# Altium schematic symbol library lib_datalogger.SchLib: 1246 symbols (part 9 of 16) (continued)
## CMP-012-000010-1
designator U?, comment IC ADP3338AKCZ-5-R7 REG LDO 5V 1A SOT223-3 SMD
IC REG LDO 5V 1A SOT223-3; Manufacturer: Analog Devices Inc.; Regulator Topology: Positive Fixed; Number of Regulators: 1; Voltage - Dropout (Typical): 0.19V @ 1A; Voltage - Input: Up to 8V; Source: mits.SchLib; RoHS: RoHS Compliant; Manufacturer Part Number: ADP3338AKCZ-5-R7; Operating Temperature: -40°C ~ 150°C; Voltage - Output: 5V; ComponentLink1Description: http://www.analog.com/media/en/technical-documentation/data-sheets/ADP3338.pdf; Supplier Device Package: SOT-223-3; ComponentLink1URL: http://www.analog.com/media/en/technical-documentation/data-sheets/ADP3338.pdf; Package / Case: TO-261-4, TO-261AA; Part Status: Active; Category: Integrated Circuits (ICs); Current - Limit (Min): -; Stock 1: 196; Current - Output: 1A; Packaging: Cut Tape (CT); Pricing 1: 1=3.03, 10=2.725, 100=2.2324 (USD); Design Item ID: IC ADP3338AKCZ-5-R7 REG LDO 5V 1A SOT223-3 SMD; Mounting Type: Surface Mount
footprint SOT-223
footprint SOT-223
pins: 1 GND, 2 Vout, 3 Vin, 4 Vout

## CMP-012-000011-1
designator U?, comment IC AS4C4M16S SDRAM 64MB 4MX16 54-TSOP
IC SDRAM 64MB 4MX16 54-TSOP; Manufacturer: Alliance Memory, Inc.; Part#: AS4C4M16S-6TAN; eVendor#: 1450-1154-ND; eVendorPrice: 1,81; eVendor: Digi-Key; MSRP: 1,2971; Source: mits.SchLib; Datasheet: http://www.alliancememory.com/pdf/dram/64M-AS4C4M16SA-AUTOMOTIVE.pdf; Obs: --; MOQ: 2000; Design Item ID: IC AS4C4M16S SDRAM 64MB 4MX16 54-TSOP
footprint 54-TSOP II
footprint 54-TSOP II
pins: 1 VDD (power), 2 DQ0 (io), 3 VDDQ (power), 4 DQ1 (io), 5 DQ2 (io), 6 VSSQ (power), 7 DQ3 (io), 8 DQ4 (io), 9 VDDQ (power), 10 DQ5 (io), 11 DQ6 (io), 12 VSSQ (power), 13 DQ7 (io), 14 VDD (power), 15 LDQM (in), 16 WE# (in), 17 CAS# (in), 18 RAS# (in), 19 CS# (in), 20 BA0 (in), 21 BA1 (in), 22 A10/AP (in), 23 A0 (in), 24 A1 (in), 25 A2 (in), 26 A3 (in), 27 VDD (power), 28 VSS (power), 29 A4 (in), 30 A5 (in), 31 A6 (in), 32 A7 (in), 33 A8 (in), 34 A9 (in), 35 A11 (in), 36 NC, 37 CKE (in), 38 CLK (in), 39 UDQM (in), 40 NC/RFU, 41 VSS (power), 42 DQ8 (io), 43 VDDQ (power), 44 DQ9 (io), 45 DQ10 (io), 46 VSSQ (power), 47 DQ11 (io), 48 DQ12 (io), 49 VDDQ (power), 50 DQ13 (io), 51 DQ14 (io), 52 VSSQ (power), 53 DQ15 (io), 54 VSS (power)

## CMP-012-000012-1
designator U?, comment IC AS4C4M16SA SDRAM 4MX16 166MHZ 54TSOP
IC SDRAM 4MX16 166MHZ 54TSOP; Part#: AS4C4M16SA-6TAN; Manufacturer: Alliance Memory, Inc.; eVendor#: 1450-1258-ND; eVendorPrice: 2,21; eVendor: Digi-Key; MSRP: 1,4175; MOQ: 5000; Datasheet: http://www.alliancememory.com/pdf/dram/64M-AS4C4M16SA-Automotive_v3.0_March%202015.pdf; Design Item ID: IC AS4C4M16SA SDRAM 4MX16 166MHZ 54TSOP; Obs: --; Source: mits.SchLib
footprint 54-TSOP II
footprint 54-TSOP II
pins: 1 VDD (power), 2 DQ0 (io), 3 VDDQ (power), 4 DQ1 (io), 5 DQ2 (io), 6 VSSQ (power), 7 DQ3 (io), 8 DQ4 (io), 9 VDDQ (power), 10 DQ5 (io), 11 DQ6 (io), 12 VSSQ (power), 13 DQ7 (io), 14 VDD (power), 15 LDQM (in), 16 WE# (in), 17 CAS# (in), 18 RAS# (in), 19 CS# (in), 20 BA0 (in), 21 BA1 (in), 22 A10/AP (in), 23 A0 (in), 24 A1 (in), 25 A2 (in), 26 A3 (in), 27 VDD (power), 28 VSS (power), 29 A4 (in), 30 A5 (in), 31 A6 (in), 32 A7 (in), 33 A8 (in), 34 A9 (in), 35 A11 (in), 36 NC, 37 CKE (in), 38 CLK (in), 39 UDQM (in), 40 NC/RFU, 41 VSS (power), 42 DQ8 (io), 43 VDDQ (power), 44 DQ9 (io), 45 DQ10 (io), 46 VSSQ (power), 47 DQ11 (io), 48 DQ12 (io), 49 VDDQ (power), 50 DQ13 (io), 51 DQ14 (io), 52 VSSQ (power), 53 DQ15 (io), 54 VSS (power)

## CMP-012-000013-1
designator U?, comment IC AT24C512C EEPROM 512KBIT 1MHZ 8-UFDFN
IC EEPROM 512KBIT 1MHZ 8MINIMAP; Manufacturer: Atmel; Part#: AT24C512C-MAHM-T; eVendor: Digi-Key; eVendorPrice: 1,33; eVendor#: AT24C512C-MAHM-TCT-ND; MSRP: 0,98771; Datasheet: http://media.digikey.com/pdf/Data%20Sheets/Atmel%20PDFs/AT24C512C.pdf; MOQ: 1000; Source: mits.SchLib; Design Item ID: IC AT24C512C EEPROM 512KBIT 1MHZ 8-UFDFN; Obs: --
footprint 8-DFN
footprint 8-DFN
pins: 1 A0 "DEVICE ADDRES 0", 2 A1 "DEVICE ADDRES 1", 3 A2 "DEVICE ADDRES 2", 4 GND "GROUND", 5 SDA "I2C DATA", 6 SCL "I2C DATA CLOCK", 7 WP "WRITE PROTECTION", 8 VCC "3.3V VOLTAGE SUPLY"

## CMP-012-000014-1
designator U?, comment IC AT24CM01 EEPROM 1MBIT 1MHZ 8SOIC
IC EEPROM 1MBIT 1MHZ 8SOIC; Manufacturer: Atmel; Part#: AT24CM01-SSHD-B; eVendor: Digi-Key; MSRP: 1,35075; eVendorPrice: 1,91; eVendor#: AT24CM01-SSHD-B-ND; Obs: --; MOQ: 1000; Design Item ID: IC AT24CM01 EEPROM 1MBIT 1MHZ 8SOIC; Source: mits.SchLib; Datasheet: http://www.atmel.com/Images/Atmel-8812-SEEPROM-AT24CM01-Datasheet.pdf
footprint SOIC-8
footprint SOIC-8
pins: 1 NC "No Connect", 2 A1 "DEVICE ADDRES 1", 3 A2 "DEVICE ADDRES 2", 4 GND "GROUND", 5 SDA "I2C DATA", 6 SCL "I2C DATA CLOCK", 7 WP "WRITE PROTECTION", 8 VCC "3.3V VOLTAGE SUPLY"

## CMP-012-000015-1
designator U?, comment IC AT97SC3205T CRYPTO TPM TSSOP
IC CRYPTO TPM TSSOP; Manufacturer: Atmel; Part#: AT97SC3205T-U3A16-20; eVendor: Digi-Key; eVendorPrice: 3,15131; Obs: Em Falta, AT97SC3204T Disponível; eVendor#: AT97SC3205T-U3A16-20-ND; Source: mits.SchLib; Datasheet: http://www.atmel.com/images/atmel-8883s-tpm-at97sc3205t-datasheet-summary.pdf; Design Item ID: IC AT97SC3205T CRYPTO TPM TSSOP; MOQ: 1000; MSRP: 3,15131
footprint 28-TSSOP
footprint 28-TSSOP
pins: 1 SM_DAT (io) "I2C Data Input/Output", 2 SM_CLK (in) "I2C Clock Input", 3 VCC (power) "Power Supply, 3.3V", 4 GND (power) "System Ground", 5 NC "No Connect Pins", 6 GPIO/EXP-00 (io) "Ganeral Purpose Input/Output", 7 PP/GPIO/TWI_WakeUp# (io) "General Purpose Input/Output", 8 TESTI (in) "Test Input", 9 TESTBI/GPIO/XTAMPER (in) "Test Input", 10 VCC (power) "Power Supply, 3.3V", 11 GND (power) "System Ground", 12 NC "No Connect Pins", 13 NC "No Connect Pins", 14 NC "No Connect Pins", 15 NC "No Connect Pins", 16 LRESET# (in) "Reset Active-Low", 17 GPIO (io) "General Purpose Input/Output", 18 GND (power) "System Ground", 19 VCC (power) "Power Supply, 3.3V", 20 PIRQ# "SPI Interrupt Requests", 21 ATEST "Atmel Test Pins", 22 TWI_WakeUp# (in) "Low-Power Sleep Recovery", 23 ATEST "Atmel Test Pins", 24 VCC (power) "Power Supply, 3.3V", 25 GND (power) "System Ground", 26 ATEST "Atmel Test Pins", 27 NC "No Connect Pins", 28 NC "No Connect Pins"

## CMP-012-000016-2
designator U?, comment ATECC108A-SSHDA-B
ATECC108A Series 10 KB 5.5 V I2C CryptoAuthentication Device - SOIC-8; Manufacturer: Atmel; eVendorPrice: 1,42; eVendor: Digi-Key; eVendor#: ATECC108A-SSHDA-B-ND; MSRP: 0,66555; RoHS Compliant: Yes; Design Item ID: IC ATECC108A EEPROM CRYPTO 8KB I2C 8SOIC; Packaging: Rail/Tube; Part#: ATECC108A-SSHDA-B; Case/Package: SOIC; Source: mits.SchLib; MOQ: 1000; Mount: Surface Mount; Datasheet: http://www.atmel.com/Images/Atmel-8873S-CryptoAuth-ATECC108-Datasheet-Summary.pdf; Obs: --
footprint SOIC-8
footprint SOIC-8
pins: 1 NC "No Connect", 2 NC "No Connect", 3 NC "No Connect", 4 GND (power) "GROUND", 5 SDA (io) "I2C DATA", 6 SCL (in) "I2C DATA CLOCK", 7 NC "No Connect", 8 VCC (power) "3.3V VOLTAGE SUPLY"

## CMP-012-000017-1
designator U?, comment IC BSP452 SWITCH POWER HISIDE SOT223-4 SMD
IC SWITCH POWER HISIDE SOT223-4; Manufacturer: Infineon Technologies; eVendor: Digi-Key; eVendorPrice: 1,79; eVendor#: BSP452CT-ND; MSRP: 0,76818; Obs: -; Design Item ID: IC BSP452 SWITCH POWER HISIDE SOT223-4 SMD; MOQ: 1000; Datasheet: http://www.infineon.com/dgdl/Infineon-BSP452-DS-v01_00-en.pdf?folderId=db3a304314dca389011537739e37155f&fileId=db3a30431b3e89eb011b7eac4d321531&ack=t; Part#: BSP452; Source: mits.SchLib
footprint SOT-223
footprint SOT-223
pins: 1 OUT (out), 2 GND (power), 3 IN (in), 4 Vbb (power)

## CMP-012-000019-1
designator U?, comment IC BY25D40 SPI FLASH 4M SOP-8 150-mil
FLASH FLASH 4M SPI SOP-8 ROHS; Manufacturer 1: BOYAMICRO; Manufacturer Part Number 1: BY25D40ASTIG(T); Mounting Type: Surface Mount; Operating Temperature: -40°C ~ 85°C (TJ); Supplier Device Package: SOP-8; Source: mits.SchLib; Package / Case: SOP-8; Design Item ID: IC BY25D40 SPI FLASH 4M SOP-8 150-mil
footprint SOP8
footprint SOP8
pins: 1 ~{CS}, 2 SO, 3 ~{WP}, 4 VSS (power), 5 SI, 6 SCLK (power), 7 NC, 8 VCC (power)

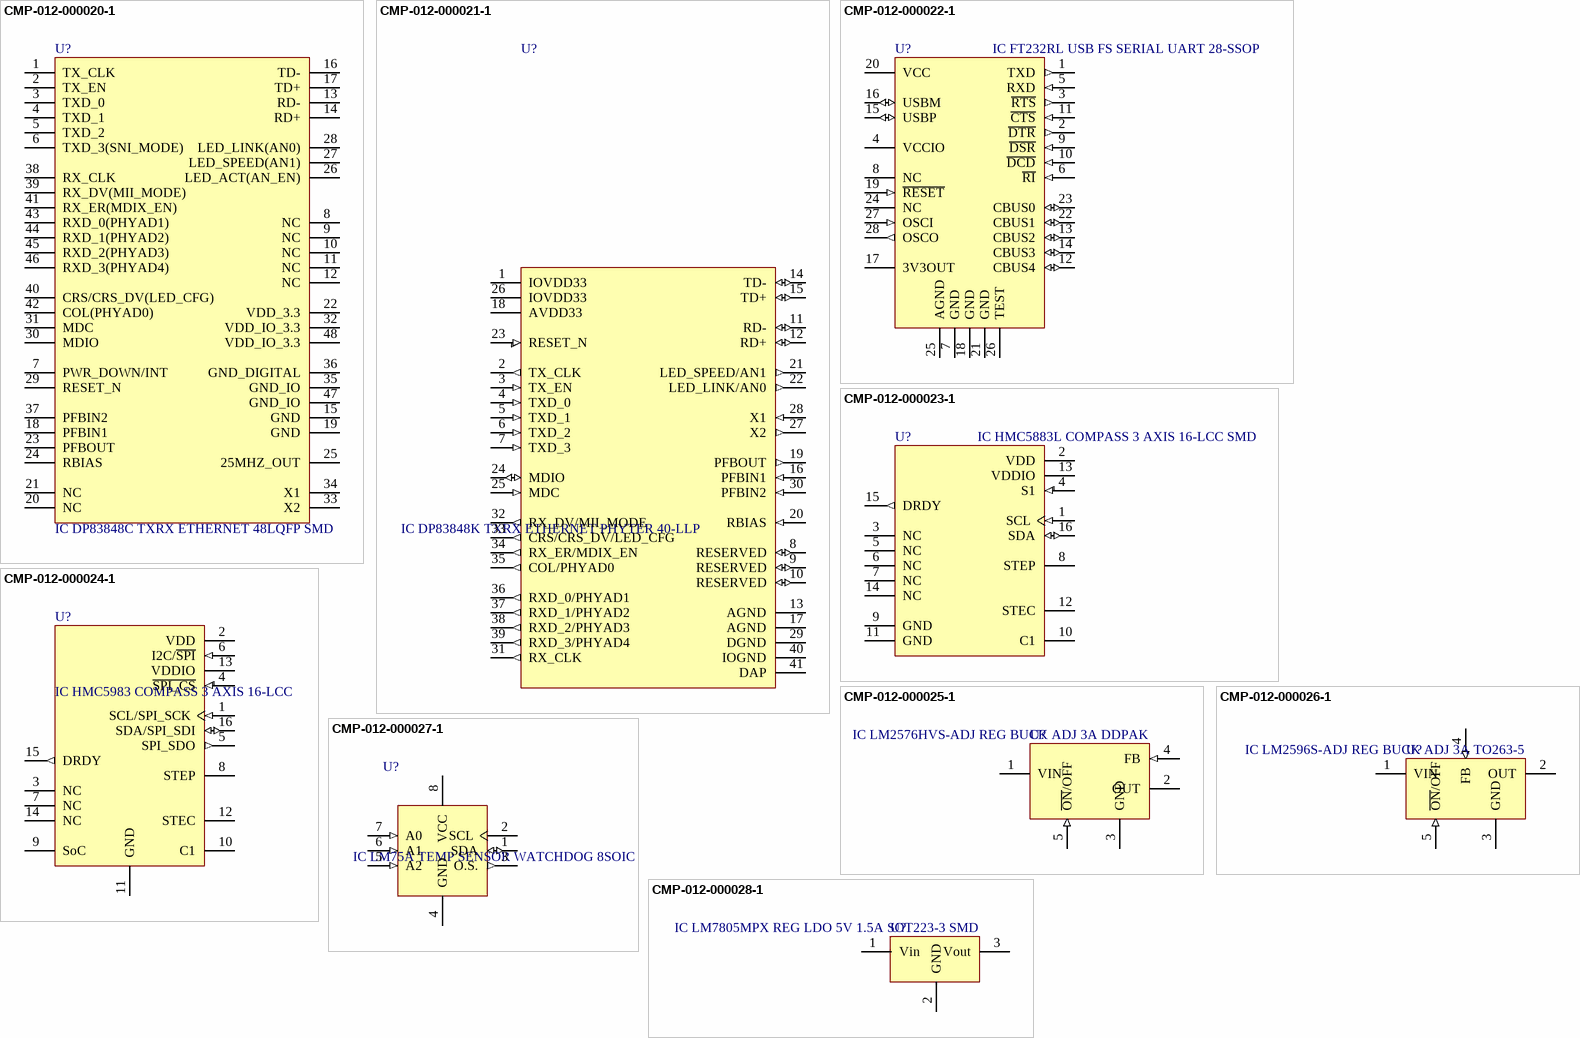
[diagram p25: symbols CMP-012-000020-1 to CMP-012-000028-1]

## CMP-012-000020-1
designator U?, comment IC DP83848C TXRX ETHERNET 48LQFP SMD
IC TXRX ETHERNET 48LQFP; Manufacturer: Texas Instruments; Manufacturer Part Number: DP83848CVVX/NOPB; Voltage - Supply: 3 V ~ 3.6 V; Number of Drivers/Receivers: 1/1; Receiver Hysteresis: -; Category: Integrated Circuits (ICs); Package / Case: 48-LQFP; Operating Temperature: 0°C ~ 70°C; Part Status: Active; RoHS: RoHS Compliant; Pricing 1: 1=5.28, 10=4.743, 100=3.8864, 500=3.30846 (USD); Stock 1: 12268; Design Item ID: IC DP83848C TXRX ETHERNET 48LQFP SMD; Mounting Type: Surface Mount; Duplex: -; Data Rate: -; Type: Transceiver; Protocol: Ethernet; ComponentLink1URL: http://www.ti.com/lit/ds/symlink/dp83848c.pdf; Packaging: Cut Tape (CT); ComponentLink1Description: http://www.ti.com/lit/ds/symlink/dp83848c.pdf; Source: mits.SchLib; Supplier Device Package: 48-LQFP (7x7)
footprint TQFP48
footprint TQFP48
pins: 1 TX_CLK "MII TX CLOCK", 2 TX_EN "MII, RMII TX ENABLE", 3 TXD_0 "DATA0", 4 TXD_1 "DATA0", 5 TXD_2 "DATA0", 6 TXD_3(SNI_MODE) "DATA0", 7 PWR_DOWN/INT "INTERRUPT", 8 NC, 9 NC, 10 NC, 11 NC, 12 NC, 13 RD- "RX- INPUT", 14 RD+ "RX+ INPUT", 15 GND (power) "ANALOG GROUND", 16 TD- "TX- OUTPUT", 17 TD+ "TX+ OUTPUT", 18 PFBIN1, 19 GND (power) "ANALOG GROUND", 20 NC, 21 NC, 22 VDD_3.3 (power) "ANALOG 3.3V SUPLY", 23 PFBOUT, 24 RBIAS, 25 25MHZ_OUT "CLOCK OUTPUT", 26 LED_ACT(AN_EN) "ACTIVITY LED", 27 LED_SPEED(AN1) "SPEED LED", 28 LED_LINK(AN0) "LINK LED", 29 RESET_N "RESET", 30 MDIO "MANAG DATA IO", 31 MDC "MANAG DATA CLK", 32 VDD_IO_3.3 (power) "IO POWER SUPLY", 33 X2 "CRYSTAL OUTPUT", 34 X1 "CRYSTAL/OSC INPUT", 35 GND_IO (power) "IO POWER SUPLY", 36 GND_DIGITAL (power) "DIGITAL GROUND", 37 PFBIN2, 38 RX_CLK "MII RX CLOCK", 39 RX_DV(MII_MODE) "RECEVIVE DATA VALID", 40 CRS/CRS_DV(LED_CFG) "CARRIER SENSE", 41 RX_ER(MDIX_EN) "RECEVIVE ERROR", 42 COL(PHYAD0) "COLISION DETECT", 43 RXD_0(PHYAD1) "RECEIVE DATA", 44 RXD_1(PHYAD2) "RECEIVE DATA", 45 RXD_2(PHYAD3) "RECEIVE DATA", 46 RXD_3(PHYAD4) "RECEIVE DATA", 47 GND_IO (power) "IO POWER SUPLY", 48 VDD_IO_3.3 (power) "IO POWER SUPLY"

## CMP-012-000021-1
designator U?, comment IC DP83848K TXRX ETHERNET PHYTER 40-LLP
IC TXRX ETHERNET PHYTER 40-LLP; Part#: DP83848KSQ/NOPB; Manufacturer: Texas Instruments; MSRP: 1,98; eVendor: Digi-Key; eVendor#: DP83848KSQ/NOPBCT-ND; eVendorPrice: 2,73; Datasheet: http://www.ti.com/lit/ds/symlink/dp83848k.pdf; Design Item ID: IC DP83848K TXRX ETHERNET PHYTER 40-LLP; Source: mits.SchLib; MOQ: 1000; Obs: --
footprint SQA40B (QFN, 40-Leads, Body 6x6mm, Pitch 0.5mm, NSC Recommended)
footprint SQA40B (QFN, 40-Leads, Body 6x6mm, Pitch 0.5mm, NSC Recommended)
pins: 1 IOVDD33 (power) "IO POWER SUPLY", 2 TX_CLK (out) "MII TRANSMIT CLOCK", 3 TX_EN (in) "MII/RMII TRANSMIT ENABLE", 4 TXD_0 (in) "MII/RMII TRANSMIT DATA", 5 TXD_1 (in) "MII/RMII TRANSMIT DATA", 6 TXD_2 (in) "MII/RMII TRANSMIT DATA", 7 TXD_3 (in) "MII/RMII TRANSMIT DATA", 8 RESERVED (io), 9 RESERVED (io), 10 RESERVED (io), 11 RD- (io) "RX- INPUT", 12 RD+ (io) "RX+ INPUT", 13 AGND (power) "ANALOG GROUND", 14 TD- (io) "TX- OUTPUT", 15 TD+ (io) "TX+ OUTPUT", 16 PFBIN1 (in), 17 AGND (power) "ANALOG GROUND", 18 AVDD33 (power) "IO POWER SUPLY", 19 PFBOUT (out), 20 RBIAS (in), 21 LED_SPEED/AN1 (out) "SPEED LED", 22 LED_LINK/AN0 (out) "LINK LED / LINK/ACT LED", 23 RESET_N (in) "RESET", 24 MDIO (io) "MANAGEMENT DATA I/O", 25 MDC (in) "MANAGEMENT DATA CLOCK", 26 IOVDD33 (power) "IO POWER SUPLY", 27 X2 (out) "CRYSTAL OUTPUT", 28 X1 (in) "CRYSTAL/OSC INPUT", 29 DGND (power) "DIGITAL GROUND", 30 PFBIN2 (in), 31 RX_CLK (out) "MII RECEIVE CLOCK", 32 RX_DV/MII_MODE (out) "MII RECEIVE DATA VALID / RMII Synchronous Receive Data Valid", 33 CRS/CRS_DV/LED_CFG (out) "MII/RMII CARRIER SENSE / RECEIVE DATA VALID", 34 RX_ER/MDIX_EN (out) "MII/RMII RECEVIVE ERROR", 35 COL/PHYAD0 (out) "MII/RMII COLISION DETECT", 36 RXD_0/PHYAD1 (out) "MII/RMII RECEIVE DATA", 37 RXD_1/PHYAD2 (out) "MII/RMII RECEIVE DATA", 38 RXD_2/PHYAD3 (out) "MII/RMII RECEIVE DATA", 39 RXD_3/PHYAD4 (out) "MII/RMII RECEIVE DATA", 40 IOGND (power) "IO POWER SUPLY", 41 DAP (power) "Die Attached Pad (DAP)"

## CMP-012-000022-1
designator U?, comment IC FT232RL USB FS SERIAL UART 28-SSOP
IC USB FS SERIAL UART 28-SSOP; Manufacturer: FTDI, Future Technology Devices International Ltd; Part#: FT232RL-REEL; eVendor: Digi-Key; eVendorPrice: 4,50; eVendor#: 768-1007-1-ND; MSRP: 2,85; MOQ: 1000; Design Item ID: IC FT232RL USB FS SERIAL UART 28-SSOP; Source: mits.SchLib; Datasheet: http://www.ftdichip.com/Support/Documents/DataSheets/ICs/DS_FT232R.pdf
footprint SSOP28_65P780X200 (SOP, 28-Leads, Body 10,5x5,6mm (max), Pitch 0,65mm, IPC Medium Density)
footprint SSOP28_65P780X200 (SOP, 28-Leads, Body 10,5x5,6mm (max), Pitch 0,65mm, IPC Medium Density)
pins: 1 TXD (out), 2 ~{DTR} (out), 3 ~{RTS} (out), 4 VCCIO (power), 5 RXD (in), 6 ~{RI} (in), 7 GND (power), 8 NC, 9 ~{DSR} (in), 10 ~{DCD} (in), 11 ~{CTS} (in), 12 CBUS4 (io), 13 CBUS2 (io), 14 CBUS3 (io), 15 USBP (io), 16 USBM (io), 17 3V3OUT (power), 18 GND (power), 19 ~{RESET} (in), 20 VCC (power), 21 GND (power), 22 CBUS1 (io), 23 CBUS0 (io), 24 NC, 25 AGND (power), 26 TEST (power), 27 OSCI (in), 28 OSCO (out)

## CMP-012-000023-1
designator U?, comment IC HMC5883L COMPASS 3 AXIS 16-LCC SMD
IC COMPASS 3 AXIS 16-LCC SMD; Manufacturer: Honeywell Microelectronics & Precision Sensors; Part#: HMC5883L-TR; eVendor#: 342-1082-1-ND; MSRP: 2,37; eVendorPrice: 5,55; eVendor: Digi-Key; Datasheet: http://www51.honeywell.com/aero/common/documents/myaerospacecatalog-documents/Defense_Brochures-documents/HMC5883L_3-Axis_Digital_Compass_IC.pdf; Design Item ID: IC HMC5883L COMPASS 3 AXIS 16-LCC SMD; MOQ: 1000; Source: mits.SchLib
footprint 16-LPCC
footprint 16-LPCC
pins: 1 SCL (in) "Serial Clock – I²C Master/Slave Clock", 2 VDD (power) "Power Supply (2.16V to 3.6V)", 3 NC "Not to be Connected", 4 S1 (in) "Chip Select line for SPI (active low). Tie to VDDIO for I²C Interface", 5 NC "Not to be Connected", 6 NC "Not to be Connected. No internal connection.", 7 NC "Not to be Connected", 8 STEP "Set/Reset Strap Positive – S/R Capacitor (C2) Connection", 9 GND (power) "Supply Ground", 10 C1 "Reservoir Capacitor (C1) Connection", 11 GND (power) "Supply Ground", 12 STEC "S/R Capacitor (C2) Connection – Driver Side", 13 VDDIO (power) "IO Power Supply (1.71V to VDD)", 14 NC "Not to be Connected. No internal connection.", 15 DRDY (out) "Data Ready, Interrupt Pin. Internally pulled high. Optional connection. Low for >200 µsec when data are placed in the data output registers.", 16 SDA (io) "Serial Data – I²C Master/Slave Data"

## CMP-012-000024-1
designator U?, comment IC HMC5983 COMPASS 3 AXIS 16-LCC
IC COMPASS 3 AXIS 16-LCC; Manufacturer: Honeywell Microelectronics & Precision Sensors; Part#: HMC5983-TR; eVendor: Digi-Key; MSRP: 1,57865; eVendorPrice: 3,37; eVendor#: 342-1092-1-ND; Design Item ID: IC HMC5983 COMPASS 3 AXIS 16-LCC; MOQ: 1000; Datasheet: http://www51.honeywell.com/aero/common/documents/myaerospacecatalog-documents/Defense_Brochures-documents/HMC5983_3_Axis_Compass_IC.pdf; Source: mits.SchLib
footprint 16-LPCC
footprint 16-LPCC
pins: 1 SCL/SPI_SCK (in) "Serial Clock – I²C Master/Slave Clock or SPI Serial Clock", 2 VDD (power) "Power Supply (2.16V to 3.6V)", 3 NC "Not to be Connected", 4 ~{SPI_CS} (in) "Chip Select line for SPI (active low). Tie to VDDIO for I²C Interface", 5 SPI_SDO (out) "SPI Serial Data Out", 6 I2C/~{SPI} (in) "I²C / SPI selection pin. Connect to VDD for I²C (Also connect SPI_CS to VDDIO).  Connect to GND for SPI.", 7 NC "Not to be Connected", 8 STEP "Set/Reset Strap Positive – S/R Capacitor (C2) Connection", 9 SoC "Start of Conversion (leading edge active) Connect to Ground when this  function/pad is not used in application.", 10 C1 "Reservoir Capacitor (C1) Connection", 11 GND (power) "Supply Ground", 12 STEC "S/R Capacitor (C2) Connection – Driver Side", 13 VDDIO (power) "IO Power Supply (1.71V to VDD)", 14 NC "Not to be Connected. No internal connection.", 15 DRDY (out) "Data Ready, Interrupt Pin. Internally pulled high. Optional connection. Low for >200 µsec when data are placed in the data output registers.", 16 SDA/SPI_SDI (io) "Serial Data – I²C Master/Slave Data or SPI Serial Data In or SPI Serial Data I/O  (SDI/O) for 3-wire interface"

## CMP-012-000025-1
designator U?, comment IC LM2576HVS-ADJ REG BUCK ADJ 3A DDPAK
IC REG BUCK ADJ 3A DDPAK; Manufacturer Part Number: LM2576HVSX-ADJ/NOPB; Manufacturer: Texas Instruments; Synchronous Rectifier: No; Voltage - Output (Max): 57V; Output Type: Adjustable; Voltage - Output (Min/Fixed): 1.23V; Output Configuration: Positive; Voltage - Input (Max): 60V; Voltage - Input (Min): 4V; Frequency - Switching: 52kHz; Number of Outputs: 1; Function: Step-Down; Category: Integrated Circuits (ICs); Topology: Buck; Source: mits.SchLib; Pricing 1: 1=6.28, 10=5.635, 100=4.623 (USD); Packaging: Cut Tape (CT); Operating Temperature: -40°C ~ 125°C (TJ); Design Item ID: IC LM2576HVS-ADJ REG BUCK ADJ 3A DDPAK; ComponentLink1Description: http://www.ti.com/lit/ds/symlink/lm2576hv.pdf; Stock 1: 2785; Package / Case: TO-263-6, D²Pak (5 Leads + Tab), TO-263BA; Supplier Device Package: DDPAK/TO-263-5; RoHS: RoHS Compliant By Exemption; ComponentLink1URL: http://www.ti.com/lit/ds/symlink/lm2576hv.pdf; Mounting Type: Surface Mount; Current - Output: 3A
footprint TO263-5
footprint TO263-5
pins: 1 VIN (power), 2 OUT (power), 3 GND (power), 4 FB (in), 5 ~{ON}/OFF (in)

## CMP-012-000026-1
designator U?, comment IC LM2596S-ADJ REG BUCK ADJ 3A TO263-5
IC REG BUCK ADJ 3A TO263-5; Manufacturer: Texas Instruments; Manufacturer Part Number: LM2596S-ADJ/NOPB; Voltage - Input (Max): 40V; Voltage - Output (Max): 37V; Voltage - Output (Min/Fixed): 1.2V; eVendor: Digi-Key; Function: Step-Down; Frequency - Switching: 150kHz; Synchronous Rectifier: No; Output Type: Adjustable; Observação: Na ausência do componente SMD TO263, pode utilizar o componente TH TO220-T de partnumber LM2576HVT-ADJ; Number of Outputs: 1; eVendor#: LM2596S-ADJ/NOPB-ND; eVendorPrice: 5,44; Voltage - Input (Min): 4.5V; Output Configuration: Positive; MSRP: 2,43; Source: mits.SchLib; Supplier Device Package: DDPAK/TO-263-5; Package / Case: TO-263-6, D²Pak (5 Leads + Tab), TO-263BA; Current - Output: 3A; Pricing 1: 1=5.15, 10=4.627, 100=3.7908, 500=3.22704, 1000=2.43 (USD); Operating Temperature: -40°C ~ 125°C (TJ); ComponentLink1URL: http://www.ti.com/lit/ds/symlink/lm2596.pdf; Mounting Type: Surface Mount; MOQ: 1000; Category: Integrated Circuits (ICs); RoHS: RoHS Compliant By Exemption; Part#: LM2596S-ADJ/NOPB; Design Item ID: IC LM2596S-ADJ REG BUCK ADJ 3A TO263-5; Topology: Buck; Datasheet: http://www.ti.com/lit/ds/symlink/lm2596.pdf; ComponentLink1Description: http://www.ti.com/lit/ds/symlink/lm2596.pdf; Stock 1: 1915; Packaging: Tube
footprint TO263-5
footprint TO263-5
pins: 1 VIN (power), 2 OUT (power), 3 GND (power), 4 FB (in), 5 ~{ON}/OFF (in)

## CMP-012-000027-1
designator U?, comment IC LM75A TEMP SENSOR WATCHDOG 8SOIC
IC TEMP SENSOR WATCHDOG 8SOIC; Part#: LM75AIMX/NOPB; Manufacturer: Texas Instruments; eVendorPrice: 1,85; eVendor: Digi-Key; eVendor#: LM75AIMX/NOPBCT-ND; MSRP: 0,50625; Design Item ID: IC LM75A TEMP SENSOR WATCHDOG 8SOIC; MOQ: 1000; Obs: --; Datasheet: http://www.ti.com/lit/ds/symlink/lm75a.pdf; Source: mits.SchLib
footprint SOIC-8
footprint SOIC-8
pins: 1 SDA (io) "I2C DATA", 2 SCL "I2C DATA CLOCK", 3 O.S. (out) "Overtemperature Shutdown, Open Drain Output", 4 GND "GROUND", 5 A2 (in) "DEVICE ADDRES 2", 6 A1 (in) "DEVICE ADDRES 1", 7 A0 (in) "DEVICE ADDRES 0", 8 VCC "3.3V VOLTAGE SUPLY"

## CMP-012-000028-1
designator U?, comment IC LM7805MPX REG LDO 5V 1.5A SOT223-3 SMD
IC REG LINEAR 5V 1.5A SOT223-4; Manufacturer Part Number: LM7805MPX/NOPB; Manufacturer: Texas Instruments; Quiescent Current: 8mA; Dropout Voltage: 2V; ComponentLink1URL: http://www.ti.com/lit/ds/symlink/lm340.pdf; Pricing 1: 1=1,36000, 10=1,21500, 25=1,15360, 100=0,88580, 250=0,78280, 500=0,74160, 1000=0,57680 (USD); Design Item ID: IC LM7805MPX REG LDO 5V 1.5A SOT223-3 SMD; Lead Free: Lead Free; Stock 1: 3664; Category: Voltage Regulators - Linear; RoHS: No; ComponentLink1Description: http://www.ti.com/lit/ds/symlink/lm340.pdf; Min Operating Temperature: 0°C; Max Operating Temperature: 125°C; Source: mits.SchLib
footprint SOT-223
footprint SOT-223
pins: 1 Vin, 2 GND, 3 Vout, 4 GND

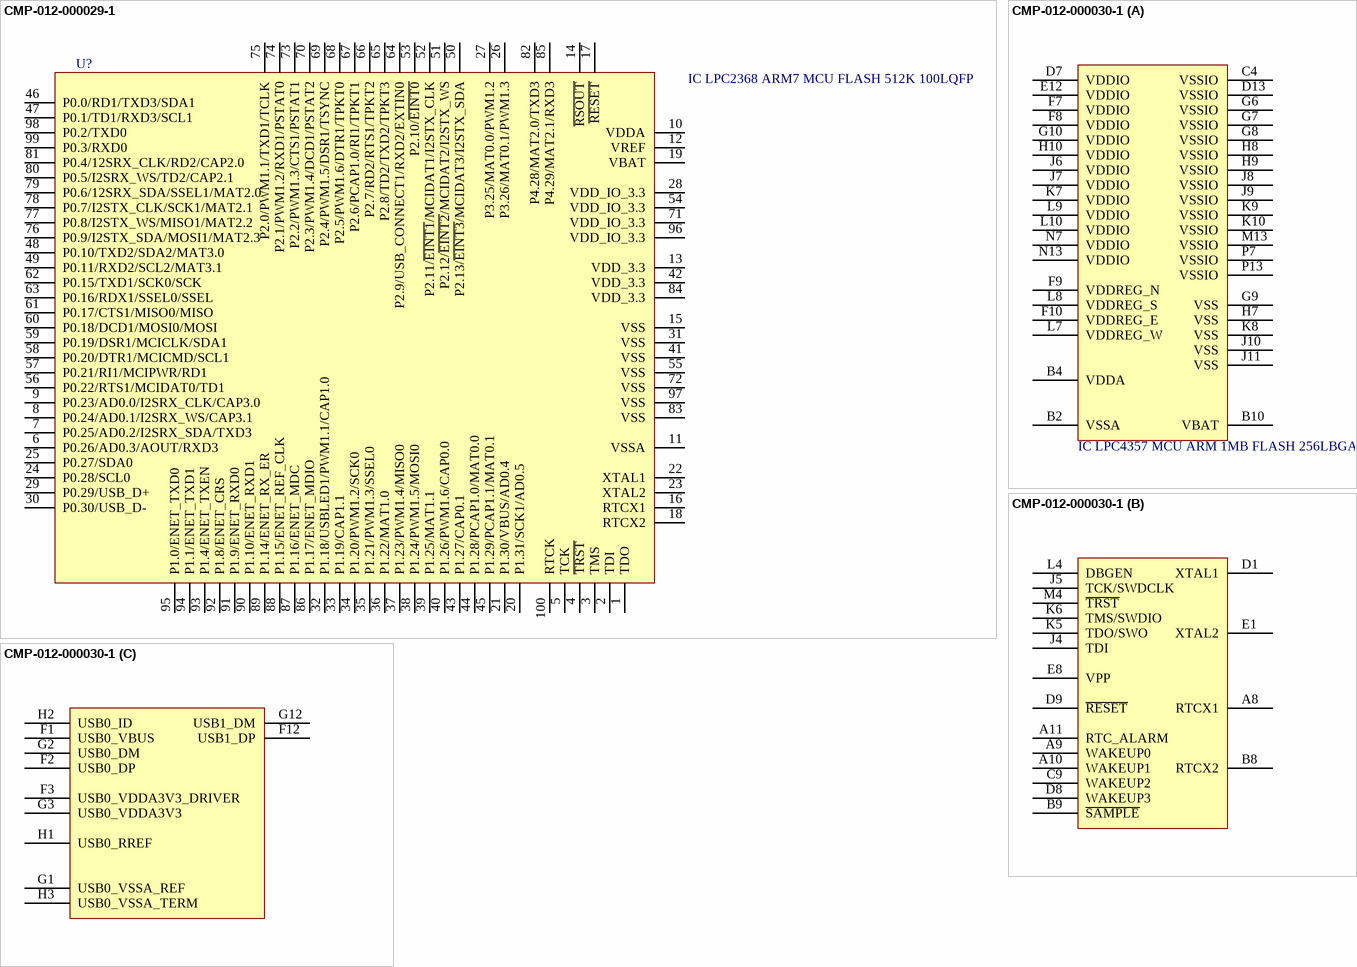
[diagram p26: symbols CMP-012-000029-1 to CMP-012-000030-1]

## CMP-012-000029-1
designator U?, comment IC LPC2368 ARM7 MCU FLASH 512K 100LQFP
IC MCU 32BIT 512KB FLASH 100LQFP; Manufacturer Part Number: LPC2368FBD100,551; Manufacturer: NXP USA Inc.; Data Converters: A/D 6x10b; D/A 1x10b; Connectivity: CAN, Ethernet, I²C, Microwire, Memory Card, SPI, SSI, SSP, UART/USART, USB; Number of I/O: 70; RAM Size: 58K x 8; Core Processor: ARM7®; Core Size: 16/32-Bit; Peripherals: Brown-out Detect/Reset, DMA, I²S, POR, PWM, WDT; Oscillator Type: Internal; Program Memory Size: 512KB (512K x 8); Voltage - Supply (Vcc/Vdd): 3 V ~ 3.6 V; Speed: 72MHz; ComponentLink1Description: http://www.nxp.com/documents/data_sheet/LPC2364_65_66_67_68.pdf; Pricing 1: 1=11.55, 10=10.615, 100=8.965, 500=7.975, 1000=7.315 (USD); ComponentLink1URL: http://www.nxp.com/documents/data_sheet/LPC2364_65_66_67_68.pdf; EEPROM Size: -; Source: mits.SchLib; Category: Integrated Circuits (ICs); Design Item ID: IC LPC2368 ARM7 MCU FLASH 512K 100LQFP; Packaging: Tray; RoHS: RoHS Compliant; Supplier Device Package: 100-LQFP (14x14); Operating Temperature: -40°C ~ 85°C (TA); Part Status: Active; Package / Case: 100-LQFP; Stock 1: 3240; Program Memory Type: FLASH
footprint TQFP100
footprint TQFP100
pins: 1 TDO, 2 TDI, 3 TMS, 4 ~{TRST}, 5 TCK, 6 P0.26/AD0.3/AOUT/RXD3 (hiz), 7 P0.25/AD0.2/I2SRX_SDA/TXD3 (hiz), 8 P0.24/AD0.1/I2SRX_WS/CAP3.1 (hiz), 9 P0.23/AD0.0/I2SRX_CLK/CAP3.0 (hiz), 10 VDDA (power), 11 VSSA (power), 12 VREF (power), 13 VDD_3.3 (power), 14 ~{RSOUT}, 15 VSS (power), 16 RTCX1, 17 ~{RESET}, 18 RTCX2, 19 VBAT (power), 20 P1.31/SCK1/AD0.5 (hiz), 21 P1.30/VBUS/AD0.4 (hiz), 22 XTAL1, 23 XTAL2, 24 P0.28/SCL0 (hiz), 25 P0.27/SDA0 (hiz), 26 P3.26/MAT0.1/PWM1.3 (hiz), 27 P3.25/MAT0.0/PWM1.2 (hiz), 28 VDD_IO_3.3 (power), 29 P0.29/USB_D+ (hiz), 30 P0.30/USB_D- (hiz), 31 VSS (power), 32 P1.18/USBLED1/PWM1.1/CAP1.0 (hiz), 33 P1.19/CAP1.1 (hiz), 34 P1.20/PWM1.2/SCK0 (hiz), 35 P1.21/PWM1.3/SSEL0 (hiz), 36 P1.22/MAT1.0 (hiz), 37 P1.23/PWM1.4/MISO0 (hiz), 38 P1.24/PWM1.5/MOSI0 (hiz), 39 P1.25/MAT1.1 (hiz), 40 P1.26/PWM1.6/CAP0.0 (hiz), 41 VSS (power), 42 VDD_3.3 (power), 43 P1.27/CAP0.1 (hiz), 44 P1.28/PCAP1.0/MAT0.0 (hiz), 45 P1.29/PCAP1.1/MAT0.1 (hiz), 46 P0.0/RD1/TXD3/SDA1 (hiz), 47 P0.1/TD1/RXD3/SCL1 (hiz), 48 P0.10/TXD2/SDA2/MAT3.0 (hiz), 49 P0.11/RXD2/SCL2/MAT3.1 (hiz), 50 P2.13/~{EINT3}/MCIDAT3/I2STX_SDA (hiz), 51 P2.12/~{EINT2}/MCIDAT2/I2STX_WS (hiz), 52 P2.11/~{EINT1}/MCIDAT1/I2STX_CLK (hiz), 53 P2.10/~{EINT0} (hiz), 54 VDD_IO_3.3 (power), 55 VSS (power), 56 P0.22/RTS1/MCIDAT0/TD1 (hiz), 57 P0.21/RI1/MCIPWR/RD1 (hiz), 58 P0.20/DTR1/MCICMD/SCL1 (hiz), 59 P0.19/DSR1/MCICLK/SDA1 (hiz), 60 P0.18/DCD1/MOSI0/MOSI (hiz), 61 P0.17/CTS1/MISO0/MISO (hiz), 62 P0.15/TXD1/SCK0/SCK (hiz), 63 P0.16/RDX1/SSEL0/SSEL (hiz), 64 P2.9/USB_CONNECT1/RXD2/EXTIN0 (hiz), 65 P2.8/TD2/TXD2/TPKT3 (hiz), 66 P2.7/RD2/RTS1/TPKT2 (hiz), 67 P2.6/PCAP1.0/RI1/TPKT1 (hiz), 68 P2.5/PWM1.6/DTR1/TPKT0 (hiz), 69 P2.4/PWM1.5/DSR1/TSYNC (hiz), 70 P2.3/PWM1.4/DCD1/PSTAT2 (hiz), 71 VDD_IO_3.3 (power), 72 VSS (power), 73 P2.2/PWM1.3/CTS1/PSTAT1 (hiz), 74 P2.1/PWM1.2/RXD1/PSTAT0 (hiz), 75 P2.0/PWM1.1/TXD1/TCLK (hiz), 76 P0.9/I2STX_SDA/MOSI1/MAT2.3 (hiz), 77 P0.8/I2STX_WS/MISO1/MAT2.2 (hiz), 78 P0.7/I2STX_CLK/SCK1/MAT2.1 (hiz), 79 P0.6/12SRX_SDA/SSEL1/MAT2.0 (hiz), 80 P0.5/I2SRX_WS/TD2/CAP2.1 (hiz), 81 P0.4/12SRX_CLK/RD2/CAP2.0 (hiz), 82 P4.28/MAT2.0/TXD3 (hiz), 83 VSS (power), 84 VDD_3.3 (power), 85 P4.29/MAT2.1/RXD3 (hiz), 86 P1.17/ENET_MDIO (hiz), 87 P1.16/ENET_MDC (hiz), 88 P1.15/ENET_REF_CLK (hiz), 89 P1.14/ENET_RX_ER (hiz), 90 P1.10/ENET_RXD1 (hiz), 91 P1.9/ENET_RXD0 (hiz), 92 P1.8/ENET_CRS (hiz), 93 P1.4/ENET_TXEN (hiz), 94 P1.1/ENET_TXD1 (hiz), 95 P1.0/ENET_TXD0 (hiz), 96 VDD_IO_3.3 (power), 97 VSS (power), 98 P0.2/TXD0 (hiz), 99 P0.3/RXD0 (hiz), 100 RTCK

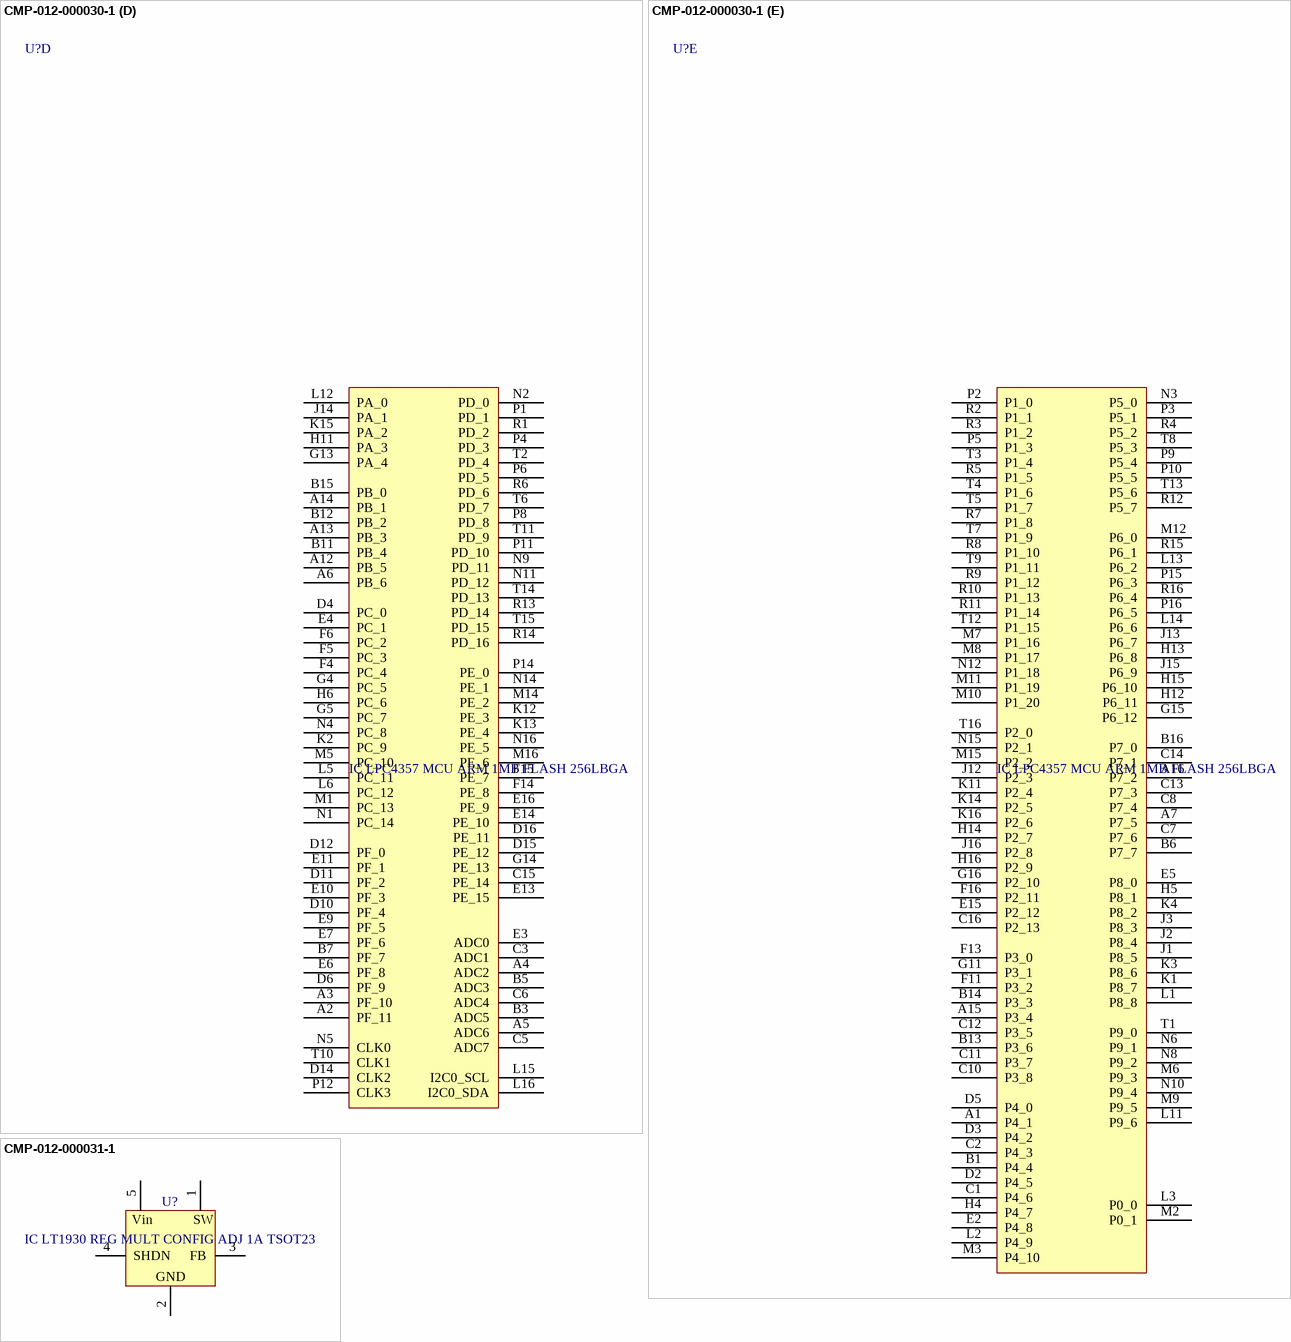
[diagram p27: symbols CMP-012-000030-1 to CMP-012-000031-1]

## CMP-012-000030-1
designator U?, comment IC LPC4357 MCU ARM 1MB FLASH 256LBGA
IC MCU ARM 1MB FLASH 256LBGA; Part#: LPC4357FET256,551; Manufacturer: NXP Semiconductors; MSRP: 8,64; eVendor: Digi-Key; eVendorPrice: 15,84; eVendor#: 568-9603-ND; Datasheet: http://www.nxp.com/documents/data_sheet/LPC435X_3X_2X_1X.pdf; Obs: --; Source: mits.SchLib; MOQ: 10000; Design Item ID: IC LPC4357 MCU ARM 1MB FLASH 256LBGA
footprint LBGA256 (LBGA256: plastic low profile ball grid array package; 256 balls; body 17 x 17 x 1 mm)
footprint LBGA256 (LBGA256: plastic low profile ball grid array package; 256 balls; body 17 x 17 x 1 mm)
part A pins: B2 VSSA (power), B4 VDDA (power), B10 VBAT (power), C4 VSSIO (power), D7 VDDIO (power), D13 VSSIO (power), E12 VDDIO (power), F7 VDDIO (power), F8 VDDIO (power), F9 VDDREG_N (power), F10 VDDREG_E (power), G6 VSSIO (power), G7 VSSIO (power), G8 VSSIO (power), G9 VSS (power), G10 VDDIO (power), H7 VSS (power), H8 VSSIO (power), H9 VSSIO (power), H10 VDDIO (power), J6 VDDIO (power), J7 VDDIO (power), J8 VSSIO (power), J9 VSSIO (power), J10 VSS (power), J11 VSS (power), K7 VDDIO (power), K8 VSS (power), K9 VSSIO (power), K10 VSSIO (power), L7 VDDREG_W (power), L8 VDDREG_S (power), L9 VDDIO (power), L10 VDDIO (power), M13 VSSIO (power), N7 VDDIO (power), N13 VDDIO (power), P7 VSSIO (power), P13 VSSIO (power)
part B pins: A8 RTCX1 (power), A9 WAKEUP0 (power), A10 WAKEUP1 (power), A11 RTC_ALARM (power), B8 RTCX2 (power), B9 ~{SAMPLE} (power), C9 WAKEUP2 (power), D1 XTAL1 (power), D8 WAKEUP3 (power), D9 ~{RESET} (power), E1 XTAL2 (power), E8 VPP (power), J4 TDI (power), J5 TCK/SWDCLK (power), K5 TDO/SWO (power), K6 TMS/SWDIO (power), L4 DBGEN (power), M4 ~{TRST} (power)
part C pins: F1 USB0_VBUS (power), F2 USB0_DP (power), F3 USB0_VDDA3V3_DRIVER (power), F12 USB1_DP (power), G1 USB0_VSSA_REF (power), G2 USB0_DM (power), G3 USB0_VDDA3V3 (power), G12 USB1_DM (power), H1 USB0_RREF (power), H2 USB0_ID (power), H3 USB0_VSSA_TERM (power)
part D pins: A2 PF_11, A3 PF_10, A4 ADC2, A5 ADC6, A6 PB_6, A12 PB_5, A13 PB_3, A14 PB_1, B3 ADC5, B5 ADC3, B7 PF_7, B11 PB_4, B12 PB_2, B15 PB_0, C3 ADC1, C5 ADC7, C6 ADC4, C15 PE_14, D4 PC_0, D6 PF_9, D10 PF_4, D11 PF_2, D12 PF_0, D14 CLK2, D15 PE_12, D16 PE_11, E3 ADC0, E4 PC_1, E6 PF_8, E7 PF_6, E9 PF_5, E10 PF_3, E11 PF_1, E13 PE_15, E14 PE_10, E16 PE_9, F4 PC_4, F5 PC_3, F6 PC_2, F14 PE_8, F15 PE_7, G4 PC_5, G5 PC_7, G13 PA_4, G14 PE_13, H6 PC_6, H11 PA_3, J14 PA_1, K2 PC_9, K12 PE_3, K13 PE_4, K15 PA_2, L5 PC_11, L6 PC_12, L12 PA_0, L15 I2C0_SCL, L16 I2C0_SDA, M1 PC_13, M5 PC_10, M14 PE_2, M16 PE_6, N1 PC_14, N2 PD_0, N4 PC_8, N5 CLK0, N9 PD_11, N11 PD_12, N14 PE_1, N16 PE_5, P1 PD_1, P4 PD_3, P6 PD_5, P8 PD_8, P11 PD_10, P12 CLK3, P14 PE_0, R1 PD_2, R6 PD_6, R13 PD_14, R14 PD_16, T2 PD_4, T6 PD_7, T10 CLK1, T11 PD_9, T14 PD_13, T15 PD_15
part E pins: A1 P4_1, A7 P7_5, A15 P3_4, A16 P7_2, B1 P4_4, B6 P7_7, B13 P3_6, B14 P3_3, B16 P7_0, C1 P4_6, C2 P4_3, C7 P7_6, C8 P7_4, C10 P3_8, C11 P3_7, C12 P3_5, C13 P7_3, C14 P7_1, C16 P2_13, D2 P4_5, D3 P4_2, D5 P4_0, E2 P4_8, E5 P8_0, E15 P2_12, F11 P3_2, F13 P3_0, F16 P2_11, G11 P3_1, G15 P6_12, G16 P2_10, H4 P4_7, H5 P8_1, H12 P6_11, H13 P6_8, H14 P2_7, H15 P6_10, H16 P2_9, J1 P8_5, J2 P8_4, J3 P8_3, J12 P2_3, J13 P6_7, J15 P6_9, J16 P2_8, K1 P8_7, K3 P8_6, K4 P8_2, K11 P2_4, K14 P2_5, K16 P2_6, L1 P8_8, L2 P4_9, L3 P0_0, L11 P9_6, L13 P6_2, L14 P6_6, M2 P0_1, M3 P4_10, M6 P9_3, M7 P1_16, M8 P1_17, M9 P9_5, M10 P1_20, M11 P1_19, M12 P6_0, M15 P2_2, N3 P5_0, N6 P9_1, N8 P9_2, N10 P9_4, N12 P1_18, N15 P2_1, P2 P1_0, P3 P5_1, P5 P1_3, P9 P5_4, P10 P5_5, P15 P6_3, P16 P6_5, R2 P1_1, R3 P1_2, R4 P5_2, R5 P1_5, R7 P1_8, R8 P1_10, R9 P1_12, R10 P1_13, R11 P1_14, R12 P5_7, R15 P6_1, R16 P6_4, T1 P9_0, T3 P1_4, T4 P1_6, T5 P1_7, T7 P1_9, T8 P5_3, T9 P1_11, T12 P1_15, T13 P5_6, T16 P2_0

## CMP-012-000031-1
designator U?, comment IC LT1930 REG MULT CONFIG ADJ 1A TSOT23
IC REG MULT CONFIG ADJ 1A TSOT23; Manufacturer: Linear Technology; Manufacturer Part Number: LT1930AES5#TRMPBF; Current - Output: 1A (Switch); Output Type: Adjustable; Topology: Boost, Flyback, SEPIC; Voltage - Input (Min): 2.45V; Output Configuration: Positive; Number of Outputs: 1; Voltage - Output (Max): 36V (Switch); Function: Step-Up, Step-Up/Step-Down; Frequency - Switching: 2.2MHz; Synchronous Rectifier: No; Voltage - Input (Max): 16V; Supplier Device Package: TSOT-23-5; Package / Case: SOT-23-5 Thin, TSOT-23-5; ComponentLink1URL: http://www.linear.com/docs/1112; Packaging: Cut Tape (CT); Operating Temperature: 0°C ~ 70°C (TA); Part Status: Active; Mounting Type: Surface Mount; Stock 1: 1061; Category: Integrated Circuits (ICs); Pricing 1: 1=4.73, 25=4.22, 100=2.46, 250=2.25 (USD); Source: mits.SchLib; Design Item ID: IC LT1930 REG MULT CONFIG ADJ 1A TSOT23; ComponentLink1Description: http://www.linear.com/docs/1112; RoHS: RoHS Compliant; Voltage - Output (Min/Fixed): 2.45V
footprint SOT23-5
footprint SOT23-5
pins: 1 SW, 2 GND, 3 FB, 4 SHDN, 5 Vin

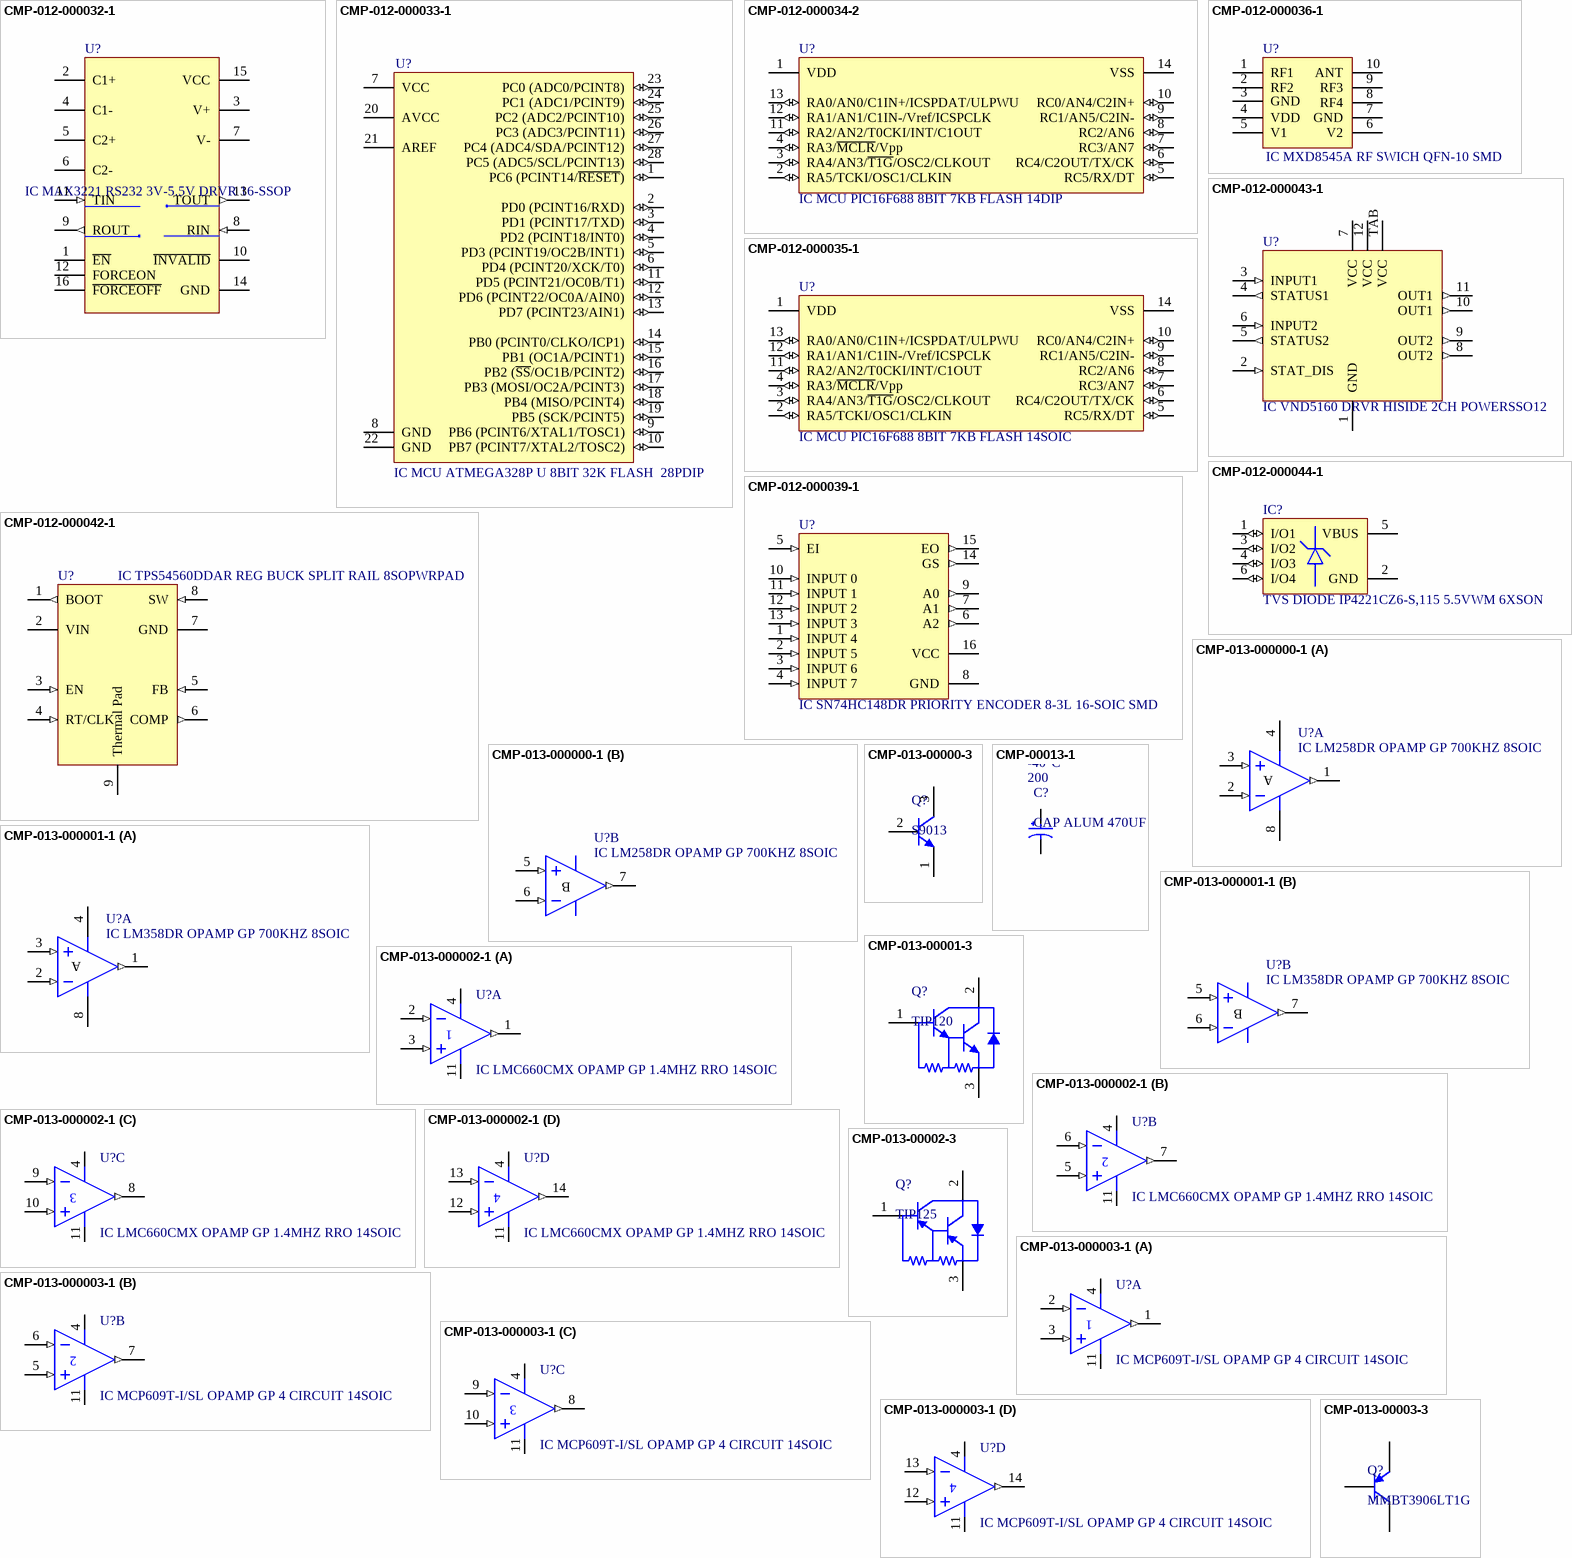
[diagram p28: symbols CMP-012-000032-1 to CMP-013-00003-3]

## CMP-012-000032-1
designator U?, comment IC MAX3221 RS232 3V-5.5V DRVR 16-SSOP
IC RS232 3V-5.5V DRVR 16-SSOP; Manufacturer Part Number: MAX3221EIDBR; Manufacturer: Texas Instruments; Duplex: Full; Data Rate: 250kbps; Number of Drivers/Receivers: 1/1; Voltage - Supply: 3 V ~ 5.5 V; Pricing 1: 1=1.98, 10=1.774, 100=1.426, 500=1.17162, 1000=0.97078 (USD); Packaging: Cut Tape (CT); ComponentLink1Description: http://www.ti.com/lit/ds/symlink/max3221e.pdf; Operating Temperature: -40°C ~ 85°C; Mounting Type: Surface Mount; Part Status: Active; Category: Integrated Circuits (ICs); Supplier Device Package: 16-SSOP; Protocol: RS232; RoHS: RoHS Compliant; ComponentLink1URL: http://www.ti.com/lit/ds/symlink/max3221e.pdf; Design Item ID: IC MAX3221 RS232 3V-5.5V DRVR 16-SSOP; Source: mits.SchLib; Type: Transceiver; Stock 1: 8582; Package / Case: 16-SSOP (0.209", 5.30mm Width)
footprint SSOP16
footprint SSOP16
pins: 1 ~{EN}, 2 C1+, 3 V+ (power), 4 C1-, 5 C2+, 6 C2-, 7 V- (power), 8 RIN (in), 9 ROUT (out), 10 ~{INVALID}, 11 TIN (in), 12 FORCEON, 13 TOUT (out), 14 GND (power), 15 VCC (power), 16 ~{FORCEOFF}

## CMP-012-000033-1
designator U?, comment IC MCU ATMEGA328P U 8BIT 32K FLASH  28PDIP
MCU 8-bit ATmega AVR RISC 32KB Flash 2.5V/3.3V/5V 28-Pin PDIP; Manufacturer Part Number: ATMEGA328-PU; Manufacturer: Microchip / Atmel; Number of I/Os: 23; Min Supply Voltage: 1.8V; Number of ADC Channels: 6; Max Frequency: 20MHz; RAM Size: 2KB; Max Supply Voltage: 5.5V; Watchdog Timer: Yes; Interface: SPI,USART,2-Wire,I2C,UART; Number of Timers/Counters: 3; Data Bus Width: 8b; Number of I2C Channels: 1; Peripherals: Brown-out Detect/Reset,POR,PWM,WDT; Oscillator Type: Internal; Packaging: Rail/Tube; RoHS: Yes; Case/Package: PDIP; Category: Microcontrollers; Radiation Hardening: No; Lead Free: Lead Free; REACH SVHC: No SVHC; Contact Plating: Tin,Matte; Source: mits.SchLib; ComponentLink2Description: https://datasheet.ciiva.com/1157/1684409-1157692.pdf?src-supplier=Element14; Number of Programmable I/O: 23; Width: 7.49mm; Frequency: 20MHz; Package Quantity: 14; ComponentLink2URL: https://datasheet.ciiva.com/1157/1684409-1157692.pdf?src-supplier=Element14; Min Operating Temperature: -40°C; Memory Size: 32KB; Mount: Through Hole; ComponentLink1Description: https://datasheet.ciiva.com/20168/73-4281-20168377.pdf?src-supplier=Rapid+Electronics; Memory Type: FLASH; Pricing 1: 1=1,90000, 25=1,74000, 100=1,58000 (USD); Number of Pins: 28; Design Item ID: IC MCU ATMEGA328P U 8BIT 32K FLASH  28PDIP; Number of PWM Channels: 6; Max Operating Temperature: 85°C; ComponentLink1URL: https://datasheet.ciiva.com/20168/73-4281-20168377.pdf?src-supplier=Rapid+Electronics; Height: 4.572mm; Stock 1: 2803; Length: 34.8mm; Number of SPI Channels: 1; Core Architecture: AVR
footprint 28 PDIP
footprint 28 PDIP
pins: 1 PC6 (PCINT14/~{RESET}) (io), 2 PD0 (PCINT16/RXD) (io), 3 PD1 (PCINT17/TXD) (io), 4 PD2 (PCINT18/INT0) (io), 5 PD3 (PCINT19/OC2B/INT1) (io), 6 PD4 (PCINT20/XCK/T0) (io), 7 VCC (power), 8 GND (power), 9 PB6 (PCINT6/XTAL1/TOSC1) (io), 10 PB7 (PCINT7/XTAL2/TOSC2) (io), 11 PD5 (PCINT21/OC0B/T1) (io), 12 PD6 (PCINT22/OC0A/AIN0) (io), 13 PD7 (PCINT23/AIN1) (io), 14 PB0 (PCINT0/CLKO/ICP1) (io), 15 PB1 (OC1A/PCINT1) (io), 16 PB2 (~{SS}/OC1B/PCINT2) (io), 17 PB3 (MOSI/OC2A/PCINT3) (io), 18 PB4 (MISO/PCINT4) (io), 19 PB5 (SCK/PCINT5) (io), 20 AVCC (power), 21 AREF (power), 22 GND (power), 23 PC0 (ADC0/PCINT8) (io), 24 PC1 (ADC1/PCINT9) (io), 25 PC2 (ADC2/PCINT10) (io), 26 PC3 (ADC3/PCINT11) (io), 27 PC4 (ADC4/SDA/PCINT12) (io), 28 PC5 (ADC5/SCL/PCINT13) (io)